# Altium footprint library 元件1.PcbLib: 420 footprints (part 23 of 27)
Each footprint in its own frame and in the unit in brackets; x right, y up, seen from the top. Pads: shape width x height; smd on the part's side, far side on the other; paste and mask are expansions set on the pad; w line width, h text height; cw(c..) or ccw(c..) is an arc to the next point about the centre after c.
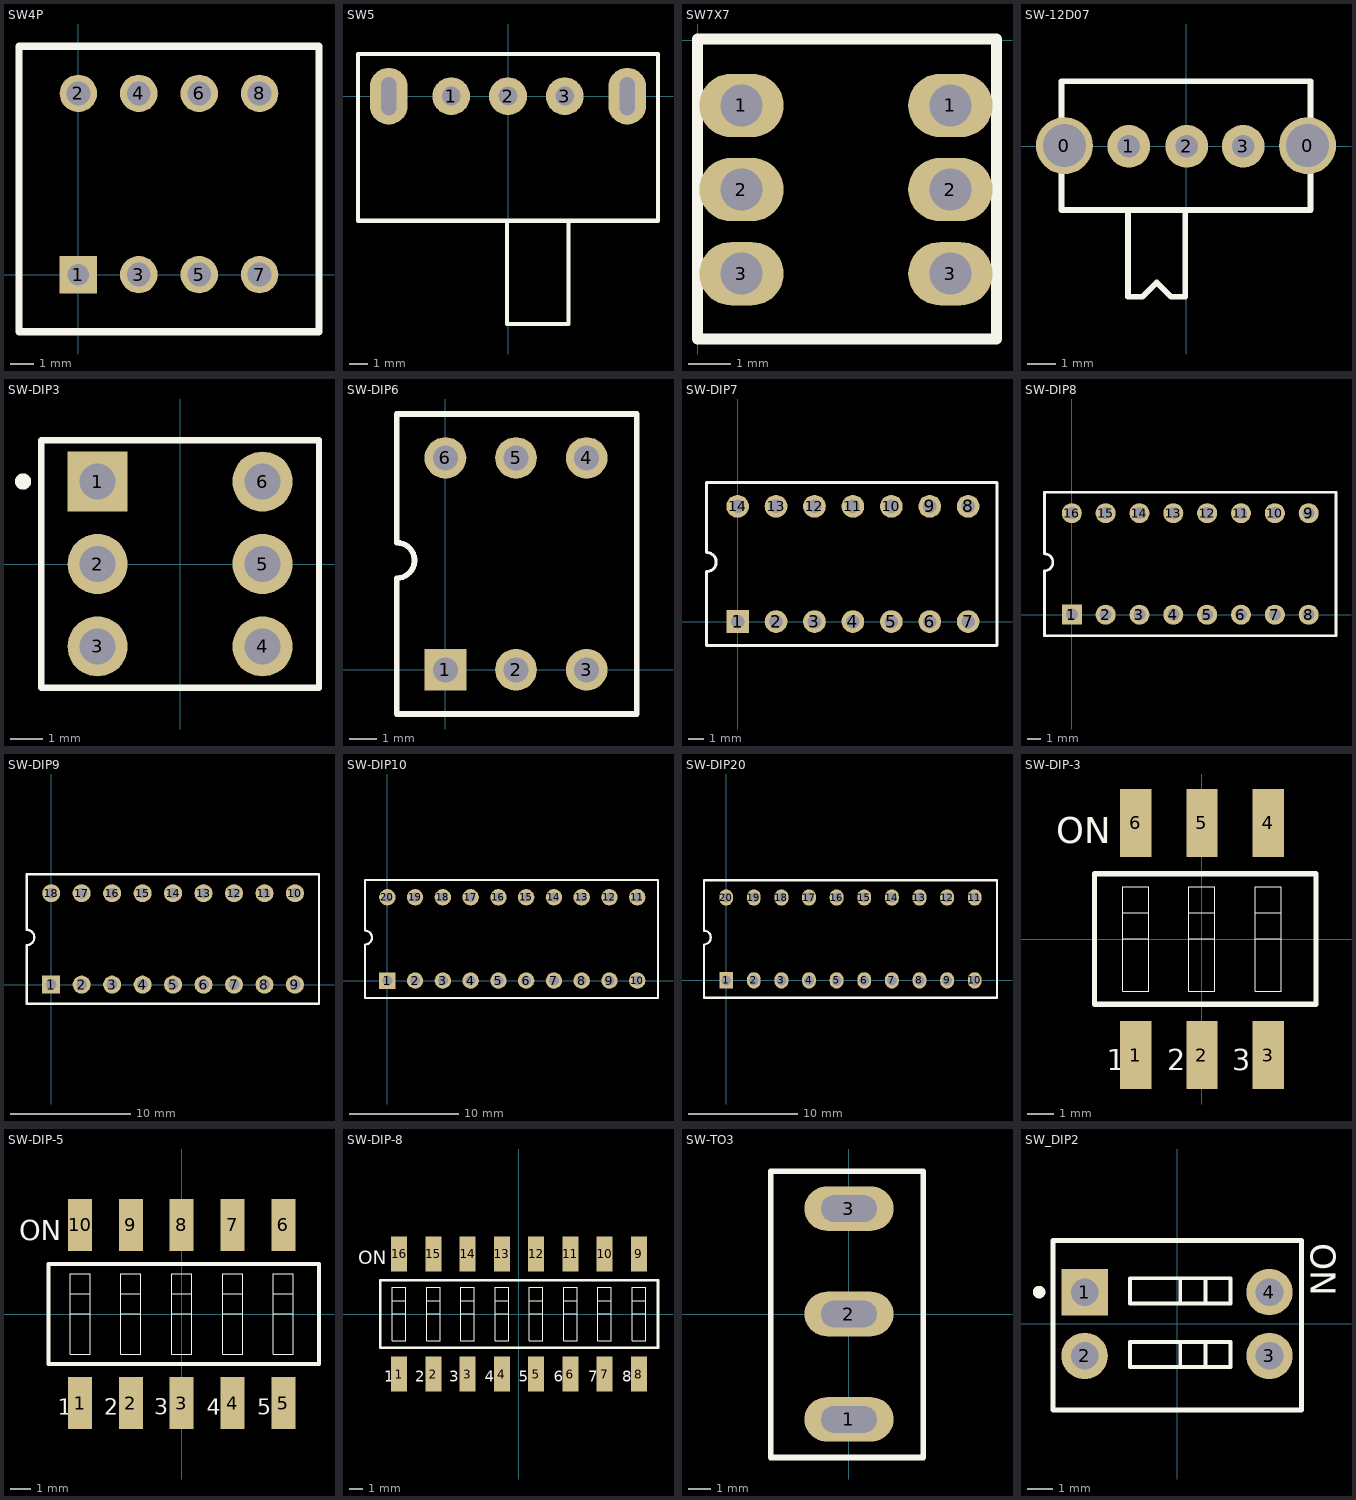
[diagram p22: the footprints below, top view; thin cyan lines are the x and y axes]

## SW4P [mil]
pads (8):
  rect 62x62 hole 35.43: 1(0,0)
  round 62 hole 39.37: 2(0,300) 3(100,0) 4(100,300) 5(200,0) 6(200,300) 7(300,0) 8(300,300)
Top Overlay:
  lines w12: -98.43,-94.49 398.43,-94.49 398.43,377.95 -98.43,377.95 -98.43,-94.49
3D body "SWDIP4.stp": height 409.45, standoff -118.11, extent -81.7,-133.46 379.72,362.6

## SW5 [mm]
pads (5):
  round 2 hole 1: 1(-3,0) 2(0,0) 3(3,0)
  oval 2x3 hole 0.8 slot 2 at 90 deg: ""(-6.3,0) ""(6.3,0)
Top Overlay:
  lines w0.203: -0.051,-6.579 -0.051,-12.04 3.2,-12.04 3.2,-6.579
  lines w0.22: -7.925,-6.579 7.925,-6.579 7.925,2.235 -7.925,2.235 -7.925,-6.579
3D body "bodongkuaiguan.STEP": height 6.25, standoff -2.85, extent -6.489,-12.266 6.511,0.634

## SW7X7 [mm]
pads (6):
  oval 2x1.5 hole 1: 1(1.041,-1.549) 1(5.994,-1.549) 2(1.041,-3.543) 2(5.994,-3.543) 3(1.041,-5.537) 3(5.994,-5.537)
Top Overlay:
  lines w0.254: 0,-7.087 0,0.025 7.087,0.025 7.087,-7.087 0,-7.087
3D body "button with fixation.step": height 13, standoff -4, extent -0.02,-7.087 6.98,-0.087

## SW-12D07 [mm] "SK12D07"
pads (5):
  round 2 hole 1.5: 0(-4.267,0.025) 0(4.267,0.025)
  round 1.5 hole 0.8: 1(-2.007,0) 2(0.025,0) 3(2.007,0)
Top Overlay:
  lines w0.203: -4.369,-2.235 -4.369,2.286 4.369,2.286 4.369,-2.235 -4.369,-2.235 ; -2.032,-5.283 -1.53,-5.283 -1.029,-4.782 -0.527,-5.283 -0.025,-5.283 -0.025,-2.235 -2.032,-2.235 -2.032,-5.182 -2.032,-5.283
3D body "User Library-CK_Slide.step": height 5, standoff -2.49, extent -4.318,-6.167 4.293,2.205

## SW-DIP3 [mm] "Switch; 6 Leads"
pads (6):
  rect 1.85x1.85 hole 1.1: 1(-2.54,2.54)
  round 1.85 hole 1.1: 2(-2.54,0) 3(-2.54,-2.54) 4(2.54,-2.54) 5(2.54,0) 6(2.54,2.54)
Top Overlay:
  circle w0.25: c-4.836,2.541 r0.125
  lines w0.2: -4.28,-3.81 -4.28,3.81 4.28,3.81 4.28,-3.81 -4.28,-3.81
3D body "SW3dPS-DIP-Schalter SMD 3polig RM2,54.STEP": height 3.55, standoff -0.65, extent -3.81,-3.683 3.81,3.937

## SW-DIP6 [mm] "DIP; 16 Leads; Row Spacing 7.62 mm; Pitch 2.54 mm"
pads (6):
  rect 1.5x1.5 hole 0.9: 1(0,0)
  round 1.5 hole 0.9: 2(2.54,0) 3(5.08,0) 4(5.08,7.62) 5(2.54,7.62) 6(0,7.62)
Top Overlay:
  lines w0.2: -1.745,4.57 cw(c-1.745,3.935) -1.745,3.3 -1.745,-1.59 6.883,-1.59 6.883,9.2 -1.745,9.2 -1.745,4.6
3D body "SWITCH DIP-3.STEP": height 7, standoff -3.7, extent -1.753,-1.165 6.867,8.735

## SW-DIP7 [mm] "DIP; 16 Leads; Row Spacing 7.62 mm; Pitch 2.54 mm"
pads (14):
  rect 1.5x1.5 hole 0.9: 1(0,0)
  round 1.5 hole 0.9: 2(2.54,0) 3(5.08,0) 4(7.62,0) 5(10.16,0) 6(12.7,0) 7(15.24,0) 8(15.24,7.62) 9(12.7,7.62) 10(10.16,7.62) 11(7.62,7.62) 12(5.08,7.62) 13(2.54,7.62) 14(0,7.62)
Top Overlay:
  lines w0.2: -2.05,4.57 cw(c-2.05,3.935) -2.05,3.3 -2.05,-1.59 17.145,-1.59 17.145,9.2 -2.05,9.2 -2.05,4.6
3D body "DIPSWITCH7.STEP": height 6.9, standoff -3.2, extent -2.05,-1.245 17.09,8.915

## SW-DIP8 [mm] "DIP; 16 Leads; Row Spacing 7.62 mm; Pitch 2.54 mm"
pads (16):
  rect 1.5x1.5 hole 0.9: 1(0,0)
  round 1.5 hole 0.9: 2(2.54,0) 3(5.08,0) 4(7.62,0) 5(10.16,0) 6(12.7,0) 7(15.24,0) 8(17.78,0) 9(17.78,7.62) 10(15.24,7.62) 11(12.7,7.62) 12(10.16,7.62) 13(7.62,7.62) 14(5.08,7.62) 15(2.54,7.62) 16(0,7.62)
Top Overlay:
  lines w0.2: -2.05,4.57 cw(c-2.05,3.935) -2.05,3.3 -2.05,-1.59 19.83,-1.59 19.83,9.2 -2.05,9.2 -2.05,4.6
3D body "SW3dPS-DIP SWITCH 8 POS CTS 206.STEP": height 8.25, standoff -3.5, extent -2.286,-1.08 20.214,8.7

## SW-DIP9 [mm] "DIP; 16 Leads; Row Spacing 7.62 mm; Pitch 2.54 mm"
pads (18):
  rect 1.5x1.5 hole 0.9: 1(0,0)
  round 1.5 hole 0.9: 2(2.54,0) 3(5.08,0) 4(7.62,0) 5(10.16,0) 6(12.7,0) 7(15.24,0) 8(17.78,0) 9(20.32,0) 10(20.32,7.62) 11(17.78,7.62) 12(15.24,7.62) 13(12.7,7.62) 14(10.16,7.62) 15(7.62,7.62) 16(5.08,7.62) 17(2.54,7.62) 18(0,7.62)
Top Overlay:
  lines w0.2: -2.05,4.57 cw(c-2.05,3.935) -2.05,3.3 -2.05,-1.59 22.327,-1.59 22.327,9.2 -2.05,9.2 -2.05,4.6
3D body "DIPSWITCH9.STEP": height 6.9, standoff -3.2, extent -2.046,-1.245 22.174,8.915

## SW-DIP10 [mm] "DIP; 16 Leads; Row Spacing 7.62 mm; Pitch 2.54 mm"
pads (20):
  rect 1.5x1.5 hole 0.9: 1(0,0)
  round 1.5 hole 0.9: 2(2.54,0) 3(5.08,0) 4(7.62,0) 5(10.16,0) 6(12.7,0) 7(15.24,0) 8(17.78,0) 9(20.32,0) 10(22.86,0) 11(22.86,7.62) 12(20.32,7.62) 13(17.78,7.62) 14(15.24,7.62) 15(12.7,7.62) 16(10.16,7.62) 17(7.62,7.62) 18(5.08,7.62) 19(2.54,7.62) 20(0,7.62)
Top Overlay:
  lines w0.2: -2.05,4.57 cw(c-2.05,3.935) -2.05,3.3 -2.05,-1.59 24.765,-1.59 24.765,9.2 -2.05,9.2 -2.05,4.6
3D body "DIPSWITCH10.STEP": height 6.9, standoff -3.2, extent -2.007,-1.295 24.753,8.865

## SW-DIP20 [mm] "DIP; 16 Leads; Row Spacing 7.62 mm; Pitch 2.54 mm"
pads (20):
  rect 1.27x1.5 hole 0.9: 1(0,0)
  oval 1.27x1.5 hole 0.9: 2(2.54,0) 3(5.08,0) 4(7.62,0) 5(10.16,0) 6(12.7,0) 7(15.24,0) 8(17.78,0) 9(20.32,0) 10(22.86,0) 11(22.86,7.62) 12(20.32,7.62) 13(17.78,7.62) 14(15.24,7.62) 15(12.7,7.62) 16(10.16,7.62) 17(7.62,7.62) 18(5.08,7.62) 19(2.54,7.62) 20(0,7.62)
Top Overlay:
  lines w0.2: -2.05,-1.59 -2.05,3.3 ccw(c-2.05,3.935) -2.05,4.57 ; -2.05,4.6 -2.05,9.2 ; 24.91,-1.59 24.91,9.2
  lines w0.203: -2.05,-1.59 24.892,-1.59 ; -2.05,9.2 24.892,9.2
3D body "User Library-DIP Switch Piano 10X.STEP": height 8.71, standoff -3.99, extent -2.086,-2.639 24.794,8.661

## SW-DIP-3 [mm] "DIP Switch; 16 Leads"
height 5.06
pads (6):
  rect 1.2x2.6 smd: 1(-2.54,-4.45) 2(0,-4.45) 3(2.54,-4.45) 4(2.54,4.45) 5(0,4.45) 6(-2.54,4.45)
Top Overlay:
  lines w0.025: -3.04,0 -2.04,0 ; -3.04,1 -2.04,1 ; -0.5,0 0.5,0 ; -0.5,1 0.5,1 ; 2.04,0 3.04,0 ; 2.04,1 3.04,1 ; -3.04,-2 -3.04,2 -2.04,2 -2.04,-2 -3.04,-2 ; -0.5,-2 -0.5,2 0.5,2 0.5,-2 -0.5,-2 ; 2.04,-2 2.04,2 3.04,2 3.04,-2 2.04,-2
  lines w0.2: -4.115,-2.5 -4.115,2.5 4.369,2.5 4.369,-2.5 -4.115,-2.5
  text "3" at 1.169,-5.032 h0.8
  text "2" at -1.331,-5.032 h0.8
  text "1" at -3.656,-5.032 h0.8
  text "ON" at -5.588,3.678 h1
3D body "DIP3.stp": height 4.4, standoff 0, extent -4.293,-4.951 4.267,4.849

## SW-DIP-5 [mm] "DIP Switch; 16 Leads"
height 5.06
pads (10):
  rect 1.2x2.6 smd: 1(-5.08,-4.45) 2(-2.54,-4.45) 3(0,-4.45) 4(2.54,-4.45) 5(5.08,-4.45) 6(5.08,4.45) 7(2.54,4.45) 8(0,4.45) 9(-2.54,4.45) 10(-5.08,4.45)
Top Overlay:
  lines w0.025: -5.58,0 -4.58,0 ; -5.58,1 -4.58,1 ; -3.04,0 -2.04,0 ; -3.04,1 -2.04,1 ; -0.5,0 0.5,0 ; -0.5,1 0.5,1 ; 2.04,0 3.04,0 ; 2.04,1 3.04,1 ; 4.58,0 5.58,0 ; 4.58,1 5.58,1 ; -5.58,-2 -5.58,2 -4.58,2 -4.58,-2 -5.58,-2 ; -3.04,-2 -3.04,2 -2.04,2 -2.04,-2 -3.04,-2 ; -0.5,-2 -0.5,2 0.5,2 0.5,-2 -0.5,-2 ; 2.04,-2 2.04,2 3.04,2 3.04,-2 2.04,-2 ; 4.58,-2 4.58,2 5.58,2 5.58,-2 4.58,-2
  lines w0.2: -6.655,-2.5 -6.655,2.5 6.858,2.5 6.858,-2.5 -6.655,-2.5
  text "5" at 3.779,-5.032 h0.8
  text "4" at 1.254,-5.032 h0.8
  text "3" at -1.371,-5.032 h0.8
  text "2" at -3.871,-5.032 h0.8
  text "1" at -6.196,-5.032 h0.8
  text "ON" at -8.128,3.678 h1
3D body "DIP5.stp": height 4.4, standoff 0, extent -6.795,-5.105 6.845,4.695

## SW-DIP-8 [mm] "DIP Switch; 16 Leads"
height 5.06
pads (16):
  rect 1.2x2.6 smd: 1(-8.89,-4.45) 2(-6.35,-4.45) 3(-3.81,-4.45) 4(-1.27,-4.45) 5(1.27,-4.45) 6(3.81,-4.45) 7(6.35,-4.45) 8(8.89,-4.45) 9(8.89,4.45) 10(6.35,4.45) 11(3.81,4.45) 12(1.27,4.45) 13(-1.27,4.45) 14(-3.81,4.45) 15(-6.35,4.45) 16(-8.89,4.45)
Top Overlay:
  lines w0.025: -9.39,0 -8.39,0 ; -9.39,1 -8.39,1 ; -6.85,0 -5.85,0 ; -6.85,1 -5.85,1 ; -4.31,0 -3.31,0 ; -4.31,1 -3.31,1 ; -1.77,0 -0.77,0 ; -1.77,1 -0.77,1 ; 0.77,0 1.77,0 ; 0.77,1 1.77,1 ; 3.31,0 4.31,0 ; 3.31,1 4.31,1 ; 5.85,0 6.85,0 ; 5.85,1 6.85,1 ; 8.39,0 9.39,0 ; 8.39,1 9.39,1 ; -9.39,-2 -8.39,-2 -8.39,2 -9.39,2 -9.39,-2 ; -6.85,-2 -5.85,-2 -5.85,2 -6.85,2 -6.85,-2 ; -4.31,-2 -3.31,-2 -3.31,2 -4.31,2 -4.31,-2 ; -1.77,-2 -0.77,-2 -0.77,2 -1.77,2 -1.77,-2 ; 0.77,-2 1.77,-2 1.77,2 0.77,2 0.77,-2 ; 3.31,-2 4.31,-2 4.31,2 3.31,2 3.31,-2 ; 5.85,-2 6.85,-2 6.85,2 5.85,2 5.85,-2 ; 8.39,-2 9.39,-2 9.39,2 8.39,2 8.39,-2
  lines w0.2: -10.29,-2.5 10.31,-2.5 10.31,2.5 -10.29,2.5 -10.29,-2.5
  text "8" at 7.659,-5.032 h0.8
  text "7" at 5.119,-5.032 h0.8
  text "ON" at -11.938,3.678 h1
  text "1" at -10.006,-5.032 h0.8
  text "2" at -7.681,-5.032 h0.8
  text "3" at -5.181,-5.032 h0.8
  text "4" at -2.556,-5.032 h0.8
  text "5" at -0.031,-5.032 h0.8
  text "6" at 2.569,-5.032 h0.8
3D body "SW3dPS-219-8MST.STEP": height 4.3, standoff 0.05, extent -10.182,-4.83 10.182,5.08

## SW-TO3 [mm]
height 2.38
pads (3):
  oval 4x2 hole 1.2 slot 2.5 at 0 deg: 1(0,-4.724) 2(0,0) 3(0,4.724)
Top Overlay:
  lines w0.254: -3.504,-6.433 -3.504,6.394 3.329,6.394 3.329,-6.433 -3.504,-6.433
3D body "7101SYZBE CK switch.step": height 28.55, standoff -3.83, extent -3.43,-6.363 3.43,6.35

## SW_DIP2 [mm] "DIP Switch; 16 Leads"
height 5.06
pads (4):
  rect 1.85x1.85 hole 1.1: 1(-3.683,1.27)
  round 1.85 hole 1.1: 2(-3.683,-1.27) 3(3.683,-1.27) 4(3.683,1.27)
Top Overlay:
  circle w0.25: c-5.496,1.271 r0.125
  lines w0.152: 0.127,-1.719 0.127,-0.719 ; 0.127,0.821 0.127,1.821 ; 1.127,-1.719 1.127,-0.719 ; 1.127,0.821 1.127,1.821 ; -1.873,-1.719 -1.873,-0.719 2.127,-0.719 2.127,-1.719 -1.873,-1.719 ; -1.873,0.821 -1.873,1.821 2.127,1.821 2.127,0.821 -1.873,0.821
  lines w0.2: -4.94,-3.429 4.953,-3.429 4.953,3.327 -4.94,3.327 -4.94,-3.429
  text "ON" at 5.334,3.226 h1
3D body "19619.stp": height 10.3, standoff 0, extent -5.001,-3.396 4.899,3.244